# Altium footprint library agus_lib.PcbLib: 45 footprints (part 2 of 3)
Each footprint in its own frame and in the unit in brackets; x right, y up, seen from the top. Pads: shape width x height; smd on the part's side, far side on the other; paste and mask are expansions set on the pad; w line width, h text height; cw(c..) or ccw(c..) is an arc to the next point about the centre after c.
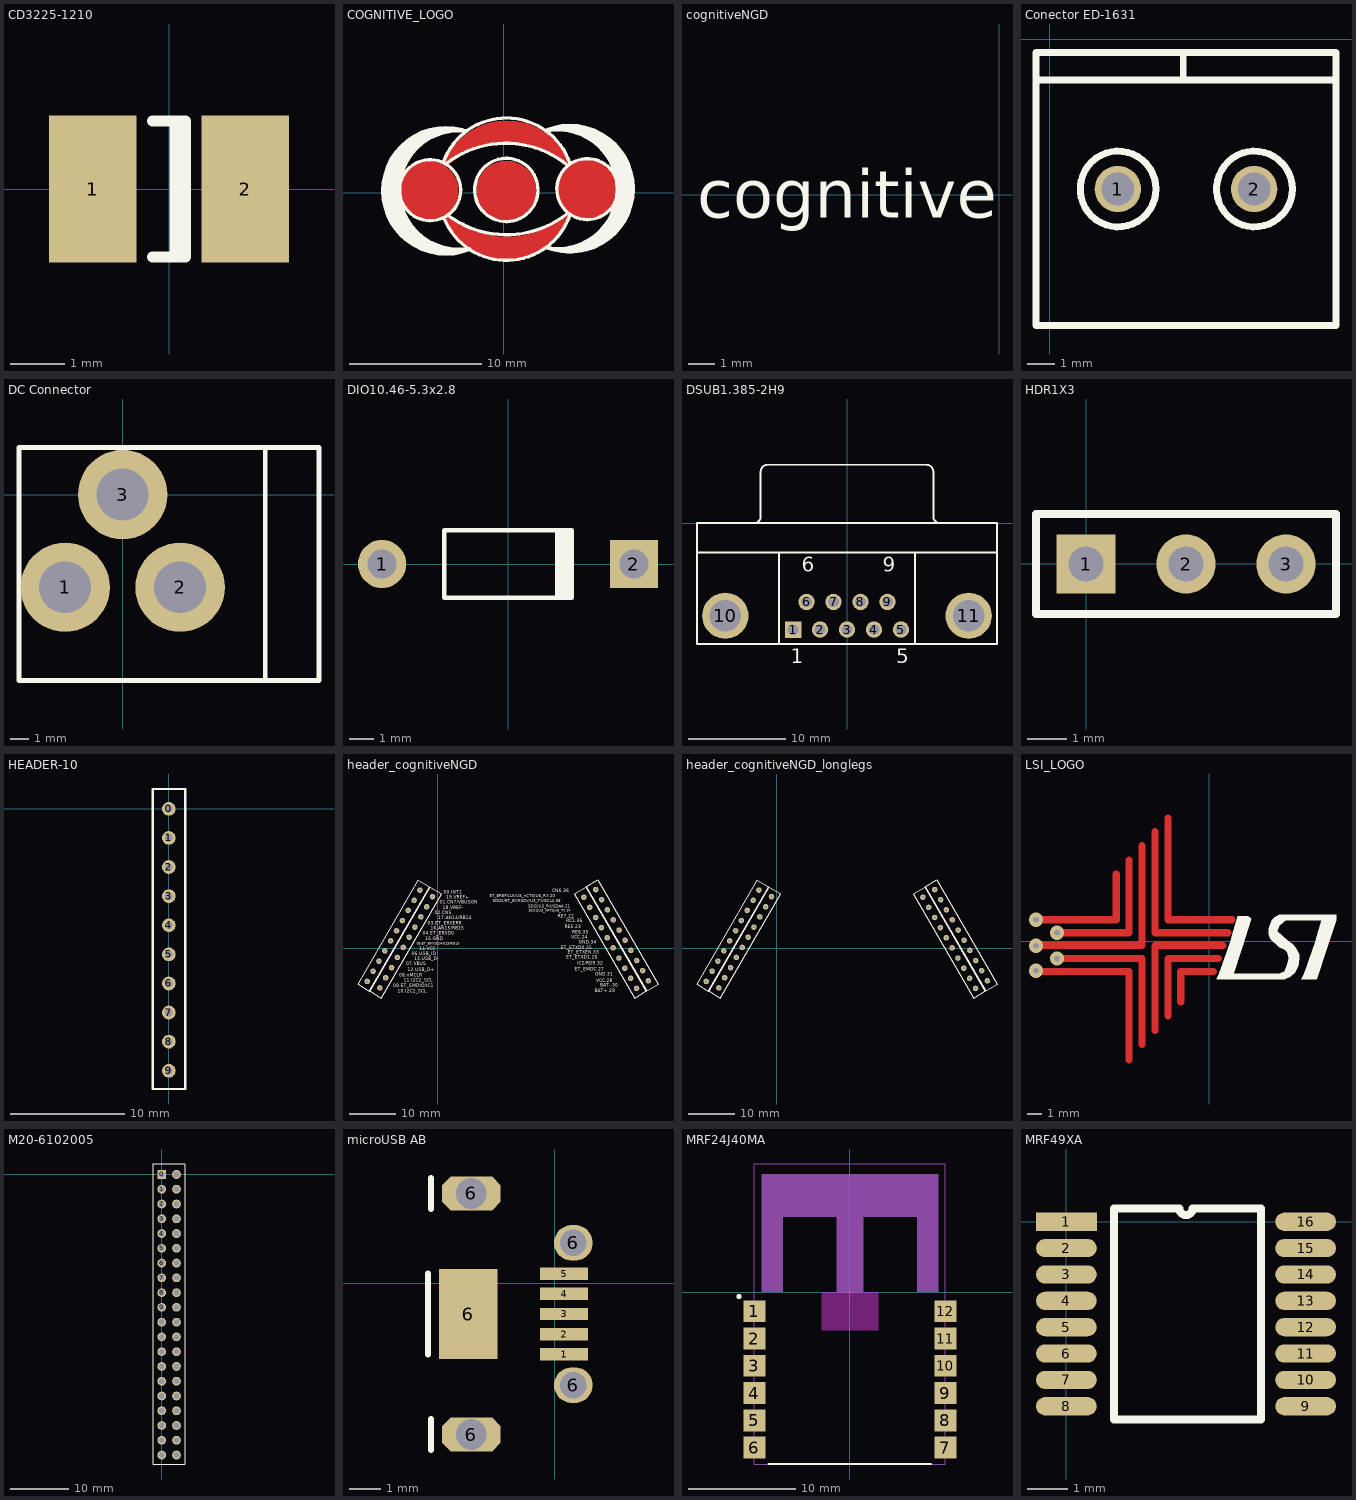
[diagram p1: the footprints below, top view; thin cyan lines are the x and y axes]

## CD3225-1210 [mm] "Chip Diode; Body 3.2 x 2.5 mm (LxW typ)"
height 1.35
pads (2):
  rect 1.6x2.7 smd: 1(-1.4,0) 2(1.4,0)
Top Overlay:
  lines w0.2: -0.3,-1.25 0.3,-1.25 0.3,1.25 -0.3,1.25 ; 0.11,-1.25 0.11,1.25
3D body: height 2.45, standoff -0.05, extent -1.57,-1.28 1.63,1.22

## COGNITIVE_LOGO [mm]
Top Layer:
  region: -5.69,-2.112 -6.129,-2.068 -6.551,-1.94 -6.94,-1.732 -7.281,-1.452 -7.561,-1.111 -7.769,-0.722 -7.897,-0.3 -7.94,0.139 -7.897,0.578 -7.769,1.001 -7.561,1.39 -7.281,1.731 -6.94,2.011 -6.551,2.219 -6.129,2.347 -5.69,2.39 -5.25,2.347 -4.828,2.219 -4.439,2.011 -4.098,1.731 -3.818,1.39 -3.61,1.001 -3.482,0.578 -3.439,0.139 -3.482,-0.3 -3.61,-0.722 -3.818,-1.111 -4.098,-1.452 -4.439,-1.732 -4.828,-1.94 -5.25,-2.068
  region: 0.2,-2.092 -0.239,-2.048 -0.661,-1.92 -1.05,-1.712 -1.391,-1.432 -1.671,-1.091 -1.879,-0.702 -2.007,-0.28 -2.05,0.159 -2.007,0.598 -1.879,1.021 -1.671,1.41 -1.391,1.751 -1.05,2.031 -0.661,2.239 -0.239,2.367 0.2,2.41 0.64,2.367 1.062,2.239 1.451,2.031 1.792,1.751 2.072,1.41 2.28,1.021 2.408,0.598 2.451,0.159 2.408,-0.28 2.28,-0.702 2.072,-1.091 1.792,-1.432 1.451,-1.712 1.062,-1.92 0.64,-2.048
  region: 6.356,-1.996 5.917,-1.953 5.495,-1.825 5.106,-1.617 4.765,-1.337 4.485,-0.996 4.277,-0.607 4.149,-0.184 4.106,0.255 4.149,0.694 4.277,1.116 4.485,1.505 4.765,1.846 5.106,2.126 5.495,2.334 5.917,2.462 6.356,2.506 6.795,2.462 7.218,2.334 7.607,2.126 7.948,1.846 8.228,1.505 8.436,1.116 8.564,0.694 8.607,0.255 8.564,-0.184 8.436,-0.607 8.228,-0.996 7.948,-1.337 7.607,-1.617 7.218,-1.825 6.795,-1.953
  region: -4.593,1.887 -4.589,1.876 -4.491,1.836 -4.394,1.876 -4.409,1.891 -3.857,2.384 -3.251,2.814 -2.602,3.173 -1.916,3.457 -1.202,3.662 -0.471,3.787 0.27,3.828 1.012,3.787 1.743,3.662 2.457,3.457 3.142,3.173 3.792,2.814 4.397,2.384 4.79,2.033 4.789,2.032 4.783,2.025 4.876,1.987 4.974,2.027 4.988,2.062 4.987,2.062 4.988,2.06 5.015,2.071 5.056,2.169 5.036,2.216 5.043,2.22 5.029,2.263 4.729,2.871 4.352,3.434 3.905,3.944 3.396,4.391 2.832,4.768 2.224,5.068 1.582,5.286 0.917,5.418 0.24,5.462 -0.436,5.418 -1.101,5.286 -1.743,5.068 -2.351,4.768 -2.915,4.391 -3.424,3.944 -3.871,3.434 -4.248,2.871 -4.548,2.263 -4.626,2.032 -4.626,2.031 -4.644,1.988 -4.603,1.891 -4.593,1.886
  region: -4.623,-1.831 -4.608,-1.874 -4.308,-2.482 -3.931,-3.046 -3.484,-3.556 -2.975,-4.003 -2.411,-4.379 -1.803,-4.679 -1.161,-4.897 -0.496,-5.029 0.18,-5.074 0.857,-5.029 1.522,-4.897 2.164,-4.679 2.772,-4.379 3.336,-4.003 3.845,-3.556 4.292,-3.046 4.669,-2.482 4.969,-1.874 5.043,-1.655 5.042,-1.655 5.047,-1.659 5.11,-1.603 5.102,-1.595 5.11,-1.603 5.15,-1.505 5.11,-1.408 5.012,-1.367 4.915,-1.408 4.929,-1.423 4.377,-1.916 3.772,-2.345 3.122,-2.704 2.437,-2.989 1.723,-3.194 0.992,-3.318 0.25,-3.36 -0.491,-3.318 -1.222,-3.194 -1.936,-2.989 -2.622,-2.704 -3.271,-2.345 -3.877,-1.916 -4.27,-1.565 -4.268,-1.563 -4.262,-1.557 -4.355,-1.518 -4.453,-1.559 -4.492,-1.654 -4.482,-1.648 -4.497,-1.642 -4.594,-1.683 -4.635,-1.78 -4.615,-1.828
  lines w0.254: -4.506,1.988 cw(c0.24,0.279) 4.918,2.169 ; -4.497,-1.78 ccw(c0.18,0.109) 4.927,-1.6 ; -4.491,1.974 cw(c0.27,-2.791) 4.876,2.125 ; -4.355,-1.656 ccw(c0.25,3.259) 5.012,-1.505
Top Overlay:
  drawing of 13 lines, arcs and shapes, not listed
Top Solder:
  drawing of 9 lines, arcs and shapes, not listed

## cognitiveNGD [mm]
Top Layer:
  text "NGD" at 4.04,-1.03 h4.5
Top Overlay:
  text "cognitive" at -11.38,-0.87 h1.8
Top Solder:
  text "NGD" at 4.04,-1.03 h4.5

## Conector ED-1631 [mm]
height 15
pads (2):
  round 1.7 hole 1.2: 1(2.5,-5.5) 2(7.5,-5.5)
Top Overlay:
  circle w0.254: c2.511,-5.5 r1.389
  circle w0.254: c7.511,-5.5 r1.389
  lines w0.254: -0.5,-1.5 10.5,-1.5 ; 4.9,-1.5 4.9,-0.5 ; -0.5,-10.5 10.5,-10.5 10.5,-0.5 -0.5,-0.5 -0.5,-10.5
3D body: height 10, standoff -3.5, extent -0.02,-10.1 9.98,-2.1

## DC Connector [mil] "Power Jack Connector"
height 433.07
pads (3):
  round 190 hole 110: 1(-122.01,-197.01) 2(122.01,-197.01) 3(0,0)
Top Overlay:
  lines w10: 303,-395 303,100 ; -220,-395 -220,100 417,100 417,-395 -220,-395
3D body: height 433.07, standoff -137.8, extent -119.94,-374.52 424.41,-0.29

## DIO10.46-5.3x2.8 [mm] "Diode, Axial; Body 5.2 x 2.7 mm (LxDia. max), Lead Dia. 0.86 mm (max)"
height 2.8
pads (2):
  round 2 hole 1.2: 1(-5.23,0)
  rect 2x2 hole 1.2: 2(5.23,0)
Top Overlay:
  rectangle: 1.95,-1.4 2.75,1.4
  lines w0.2: 2.65,-1.4 -2.65,-1.4 -2.65,1.4 2.65,1.4
3D body: height 2.21, standoff -2.8, extent -5.345,-1.02 5.365,1

## DSUB1.385-2H9 [mm] "Connector; D Subminiature; 9 Position; Right Angle; Pitch 1.385 mm"
height 12.75
pads (11):
  rect 1.69x1.69 hole 1.09: 1(-5.54,-10.92)
  round 1.69 hole 1.09: 2(-2.77,-10.92) 3(0,-10.92) 4(2.77,-10.92) 5(5.54,-10.92) 6(-4.155,-8.08) 7(-1.385,-8.08) 8(1.385,-8.08) 9(4.155,-8.08)
  round 4.76 hole 3.26: 10(-12.495,-9.5) 11(12.495,-9.5)
Top Overlay:
  lines w0.2: -15.4,-3 15.4,-3 ; -9.56,0.005 ccw(c-9.56,0.7) -8.865,0.7 -8.865,5.3 ; -8.86,5.305 cw(c-8.165,5.305) -8.165,6 8.165,6 cw(c8.165,5.305) 8.86,5.305 ; -7,-12.4 -7,-3 ; 7,-12.4 7,-3 ; 8.865,5.3 8.865,0.7 ccw(c9.56,0.7) 9.56,0.005 ; -15.4,-12.4 15.4,-12.4 15.4,0 -15.4,0 -15.4,-12.4
  text "6" at -4.655,-4.975 h1.5
  text "9" at 3.655,-4.975 h1.5
  text "5" at 5.04,-14.375 h1.5
  text "1" at -5.79,-14.375 h1.5
3D body: height 12.25, standoff -4.05, extent -15.465,-13.09 15.345,6.11

## HDR1X3 [mm] "Connector; Header; 3 Position"
pads (3):
  rect 1.5x1.5 hole 0.9: 1(0,0)
  round 1.5 hole 0.9: 2(2.54,0) 3(5.08,0)
Top Overlay:
  lines w0.2: -1.27,-1.27 6.35,-1.27 6.35,1.27 -1.27,1.27 -1.27,-1.27
3D body: height 2.88, standoff -11.34, extent -1.143,-1.168 6.223,1.169

## HEADER-10 [mm]
pads (10):
  round 1.2 / inner oval 2.5x1.2 / far side round 1.2 hole 0.65: 0(0,0) 1(0,-2.54) 2(0,-5.08) 3(0,-7.62) 4(0,-10.16) 5(0,-12.7) 6(0,-15.24) 7(0,-17.78) 8(0,-20.32) 9(0,-22.86)
Top Overlay:
  lines w0.2: -1.4,-24.45 1.435,-24.45 1.435,1.73 -1.4,1.73 -1.4,-24.45
3D body: height 6.57, standoff -11.29, extent -1.26,-24.11 1.28,1.29
3D body: height 7, standoff -3, extent -1.26,-24.11 1.28,1.29

## header_cognitiveNGD [mm]
pads (40):
  round 1.2 / inner oval 2.5x1.2 / far side round 1.2 hole 0.65: 00(-3.826,12.617) 01(-5.096,10.417) 02(-6.366,8.217) 03(-7.636,6.018) 04(-8.906,3.818) 05(-10.176,1.618) 06(-11.446,-0.581) 07(-12.716,-2.781) 08(-13.986,-4.981) 09(-15.256,-7.181) 10(-12.527,-8.594) 11(-11.257,-6.395) 12(-9.987,-4.195) 13(-8.717,-1.995) 14(-7.447,0.204) 15(-6.177,2.404) 16(-4.907,4.604) 17(-3.637,6.804) 18(-2.367,9.003) 19(-1.097,11.203) 20(31.747,11.082) 21(33.017,8.882) 22(34.287,6.682) 23(35.557,4.483) 24(36.827,2.283) 25(38.097,0.083) 26(39.367,-2.116) 27(40.637,-4.316) 28(41.907,-6.516) 29(43.177,-8.716) 30(45.761,-7.051) 31(44.491,-4.851) 32(43.221,-2.651) 33(41.951,-0.452) 34(40.681,1.748) 35(39.411,3.948) 36(38.141,6.148) 37(36.871,8.347) 38(35.601,10.547) 39(34.331,12.747)
Top Overlay:
  lines w0.2: -17.264,-7.858 -14.808,-9.275 -1.718,13.397 -4.174,14.815 -17.264,-7.858 ; -14.635,-9.375 -1.545,13.297 0.91,11.88 -12.18,-10.793 -14.635,-9.375 ; 29.67,11.88 42.76,-10.793 45.215,-9.375 32.125,13.297 29.67,11.88 ; 32.293,13.406 45.383,-9.266 47.839,-7.849 34.749,14.824 32.293,13.406
  text "00.INT2" at 1.32,11.86 h0.75
  text "19.VREF+" at 1.86,10.73 h0.75
  text "01.CN7/VBUSON" at 0.5,9.64 h0.75
  text "18.VREF-" at 1.18,8.47 h0.75
  text "02.CN5" at -0.63,7.38 h0.75
  text "17.AN14/RB14" at 0.14,6.25 h0.75
  text "03.ET_ERXERR" at -2.08,5.07 h0.75
  text "16.AN15/RB15" at -1.49,4.03 h0.75
  text "04.ET_ERXD0" at -3.25,2.9 h0.75
  text "15.GND" at -2.67,1.71 h0.75
  text "05.ET_ERXD1/AN13/RB13" at -4.56,0.81 h0.55
  text "06.USB_ID" at -5.61,-1.48 h0.75
  text "07.VBUS" at -6.83,-3.66 h0.75
  text "08.nMCLR" at -8.28,-6.15 h0.75
  text "09.ET_EMDIO/IC1" at -9.59,-8.41 h0.75
  text "14.VCC" at -3.96,-0.43 h0.75
  text "13.USB_D-" at -5.01,-2.62 h0.75
  text "12.USB_D+" at -6.47,-4.97 h0.75
  text "11.I2C2_SCL" at -7.37,-7.28 h0.75
  text "10.I2C2_SCL" at -8.64,-9.68 h0.75
  text "ET_EREFCLK/U3_nCTS/U6_RX.20" at 11.32,11.08 h0.65
  text "CN6.36" at 24.85,12.21 h0.75
  text "VCC.24" at 29.05,2.03 h0.75
  text "ET_ETXD0.25" at 26.75,-0.16 h0.75
  text "ET_ETXD1.26" at 27.94,-2.28 h0.75
  text "ET_EMDC.27" at 29.75,-4.88 h0.75
  text "VCC.28" at 34.42,-7.35 h0.75
  text "BAT+.29" at 34.11,-9.51 h0.75
  text "SDO2/ET_ECRSDV/U3_TX/SCL4.38" at 11.97,10.02 h0.65
  text "RE6.35" at 29.21,3.2 h0.75
  text "BAT-.30" at 35.33,-8.34 h0.75
  text "GND.31" at 34.24,-5.96 h0.75
  text "IC2/RD9.32" at 30.27,-3.62 h0.75
  text "ET_ETXEN.33" at 28.2,-1.21 h0.75
  text "GND.34" at 30.65,0.97 h0.75
  text "SDI2/U3_RX/SDA4.21" at 19.68,8.78 h0.6
  text "RE7.22" at 26.09,6.65 h0.75
  text "RE5.23" at 27.63,4.39 h0.75
  text "SCK2/U3_nRTS/U6_TX.37" at 19.8,7.89 h0.55
  text "RC1.36" at 27.94,5.6 h0.75
3D body: height 7, standoff -3, extent -16.972,-8.903 -2.073,14.364
3D body: height 7, standoff -3, extent -14.281,-10.341 0.619,12.926
3D body: height 7, standoff -3, extent 30.011,-10.428 44.911,12.839
3D body: height 7, standoff -3, extent 32.598,-8.808 47.497,14.459

## header_cognitiveNGD_longlegs [mm]
pads (40):
  round 1.2 / inner oval 2.5x1.2 / far side round 1.2 hole 0.65: 00(-3.826,12.617) 01(-5.096,10.417) 02(-6.366,8.217) 03(-7.636,6.018) 04(-8.906,3.818) 05(-10.176,1.618) 06(-11.446,-0.581) 07(-12.716,-2.781) 08(-13.986,-4.981) 09(-15.256,-7.181) 10(-12.527,-8.594) 11(-11.257,-6.395) 12(-9.987,-4.195) 13(-8.717,-1.995) 14(-7.447,0.204) 15(-6.177,2.404) 16(-4.907,4.604) 17(-3.637,6.804) 18(-2.367,9.003) 19(-1.097,11.203) 20(31.747,11.082) 21(33.017,8.882) 22(34.287,6.682) 23(35.557,4.483) 24(36.827,2.283) 25(38.097,0.083) 26(39.367,-2.116) 27(40.637,-4.316) 28(41.907,-6.516) 29(43.177,-8.716) 30(45.761,-7.051) 31(44.491,-4.851) 32(43.221,-2.651) 33(41.951,-0.452) 34(40.681,1.748) 35(39.411,3.948) 36(38.141,6.148) 37(36.871,8.347) 38(35.601,10.547) 39(34.331,12.747)
Top Overlay:
  lines w0.2: -17.264,-7.858 -14.808,-9.275 -1.718,13.397 -4.174,14.815 -17.264,-7.858 ; -14.635,-9.375 -1.545,13.297 0.91,11.88 -12.18,-10.793 -14.635,-9.375 ; 29.67,11.88 42.76,-10.793 45.215,-9.375 32.125,13.297 29.67,11.88 ; 32.293,13.406 45.383,-9.266 47.839,-7.849 34.749,14.824 32.293,13.406
3D body: height 6.57, standoff -11.29, extent -16.972,-8.903 -2.073,14.364
3D body: height 7, standoff -3, extent -16.972,-8.903 -2.073,14.364
3D body: height 6.57, standoff -11.29, extent -14.281,-10.342 0.619,12.925
3D body: height 7, standoff -3, extent -14.281,-10.341 0.619,12.926
3D body: height 6.57, standoff -11.29, extent 30.011,-10.428 44.911,12.839
3D body: height 7, standoff -3, extent 30.011,-10.428 44.911,12.839
3D body: height 6.57, standoff -11.29, extent 32.598,-8.808 47.497,14.459
3D body: height 7, standoff -3, extent 32.598,-8.808 47.497,14.459

## LSI_LOGO [mm]
via -12.069,1.496 diameter 1 hole 0.4
via -10.609,0.596 diameter 1 hole 0.4
via -12.069,-0.304 diameter 1 hole 0.4
via -10.609,-1.204 diameter 1 hole 0.4
via -12.069,-2.057 diameter 1 hole 0.4
Top Layer:
  lines w0.5: -12.069,-2.104 -5.579,-2.104 -5.579,-8.267 ; -12.069,-0.304 -4.679,-0.304 -4.679,6.653 ; -12.069,1.496 -6.479,1.496 -6.479,4.693 ; -10.609,-1.204 -4.679,-1.204 -4.679,-7.197 ; -10.609,0.596 -5.579,0.596 -5.579,5.663 ; -3.779,-6.207 -3.779,-0.303 0.961,-0.303 ; -3.779,7.643 -3.779,0.593 1.311,0.593 ; -2.879,-5.197 -2.879,-1.204 0.651,-1.204 ; -2.879,8.583 -2.879,1.496 1.571,1.496 ; -1.979,-4.237 -1.979,-2.103 0.311,-2.103
Top Overlay:
  drawing of 34 lines, arcs and shapes, not listed
Top Solder:
  lines w0.5: -12.069,-2.104 -5.579,-2.104 -5.579,-8.267 ; -12.069,-0.304 -4.679,-0.304 -4.679,6.653 ; -12.069,1.496 -6.479,1.496 -6.479,4.693 ; -10.609,-1.204 -4.679,-1.204 -4.679,-7.197 ; -10.609,0.596 -5.579,0.596 -5.579,5.663 ; -3.779,-6.207 -3.779,-0.303 0.961,-0.303 ; -3.779,7.643 -3.779,0.593 1.311,0.593 ; -2.879,-5.197 -2.879,-1.204 0.651,-1.204 ; -2.879,8.583 -2.879,1.496 1.571,1.496 ; -1.979,-4.237 -1.979,-2.103 0.311,-2.103

## M20-6102005 [mm]
pads (40):
  rect 1.5x1.5 hole 1: 0(0,0)
  round 1.5 hole 1: 1(0,-2.54) 2(0,-5.08) 3(0,-7.62) 4(0,-10.16) 5(0,-12.7) 6(0,-15.24) 7(0,-17.78) 8(0,-20.32) 9(0,-22.86) 10(0,-25.4) 11(0,-27.94) 12(0,-30.48) 13(0,-33.02) 14(0,-35.56) 15(0,-38.1) 16(0,-40.64) 17(0,-43.18) 18(0,-45.72) 19(0,-48.26) 20(2.54,-48.26) 21(2.54,-45.72) 22(2.54,-43.18) 23(2.54,-40.64) 24(2.54,-38.1) 25(2.54,-35.56) 26(2.54,-33.02) 27(2.54,-30.48) 28(2.54,-27.94) 29(2.54,-25.4) 30(2.54,-22.86) 31(2.54,-20.32) 32(2.54,-17.78) 33(2.54,-15.24) 34(2.54,-12.7) 35(2.54,-10.16) 36(2.54,-7.62) 37(2.54,-5.08) 38(2.54,-2.54) 39(2.54,0)
Top Overlay:
  lines w0.2: -1.5,-49.8 1.315,-49.8 4,-49.8 3.975,1.8 -1.5,1.8 -1.5,-49.8
3D body: height 11.7, standoff -11.54, extent -1.15,-49.83 3.8,1.63

## microUSB AB [mm]
pads (10):
  rect 1.55x0.4 smd: 1(0.3,-2.3) 2(0.3,-1.65) 3(0.3,-1) 4(0.3,-0.35) 5(0.3,0.3)
  rect 1.9x2.9 smd: 6(-2.8,-1)
  oct 1.9x1.1 hole 1: 6(-2.7,-4.9) 6(-2.7,2.9)
  oval 1.25x1.15 hole 0.85: 6(0.6,-3.3) 6(0.6,1.3)
Top Overlay:
  lines w0.2: -4.1,-2.3 -4.1,0.3 ; -4,-5.4 -4,-4.4 ; -4,2.4 -4,3.4
3D body: height 2.74, standoff -0.26, extent -5.46,-5.39 0.14,3.41

## MRF24J40MA [mil] "SM Module; 12 Leads; Body 27.9x17.8x1.7mm (LxWxH), Microchip Recommended"
height 66.93
pads (12):
  rect 80x80 smd paste-159.45 mask+2: 1(-350,-70) 2(-350,-170) 3(-350,-270) 4(-350,-370) 5(-350,-470) 6(-350,-570) 7(350,-570) 8(350,-470) 9(350,-370) 10(350,-270) 11(350,-170) 12(350,-70)
Top Layer keep-out:
  rectangle: -105,-140 105,0
Top Overlay:
  circle w9.84: c-406.5,-15.75 r4.92
  lines w7.87: -297.64,-630 297.64,-630
Mechanical 13:
  rectangle: -324.8,275.59 324.8,433.07
  rectangle: -324.8,0 -246.06,275.59
  region: 324.8,275.59 246.06,275.59 246.06,0 324.8,0
  rectangle: -49.21,0 49.21,275.59
  lines w3.94: 350,-630 350,470 ; 350.39,-630 -350,-630 -350,470 350.39,470
Mechanical 15:
  lines w3.94: -19.69,0 19.68,0 ; 0,-19.68 0,19.69
3D body: height 114.24, standoff 47.2, extent -350.04,-629.92 350.04,470.08

## MRF49XA [mm]
pads (16):
  rect 1.5x0.45 smd: 1(0,0)
  oval 1.5x0.45 smd: 2(0,-0.65) 3(0,-1.3) 4(0,-1.95) 5(0,-2.6) 6(0,-3.25) 7(0,-3.9) 8(0,-4.55) 9(5.9,-4.55) 10(5.9,-3.9) 11(5.9,-3.25) 12(5.9,-2.6) 13(5.9,-1.95) 14(5.9,-1.3) 15(5.9,-0.65) 16(5.9,0)
Top Overlay:
  lines w0.2: 4.315,0.325 3.112,0.325 cw(c2.95,0.325) 2.788,0.325 1.175,0.325 1.175,-1.385 1.175,-3.165 1.175,-4.875 4.8,-4.875 4.8,-3.09 4.8,0.325 4.325,0.325
3D body: height 1.1, standoff 0, extent -0.212,-4.8 6.188,0.2